# Altium footprint library Ultrascale_PcbLib.PcbLib: 126 footprints (part 8 of 8)
Each footprint in its own frame and in the unit in brackets; x right, y up, seen from the top. Pads: shape width x height; smd on the part's side, far side on the other; paste and mask are expansions set on the pad; w line width, h text height; cw(c..) or ccw(c..) is an arc to the next point about the centre after c.
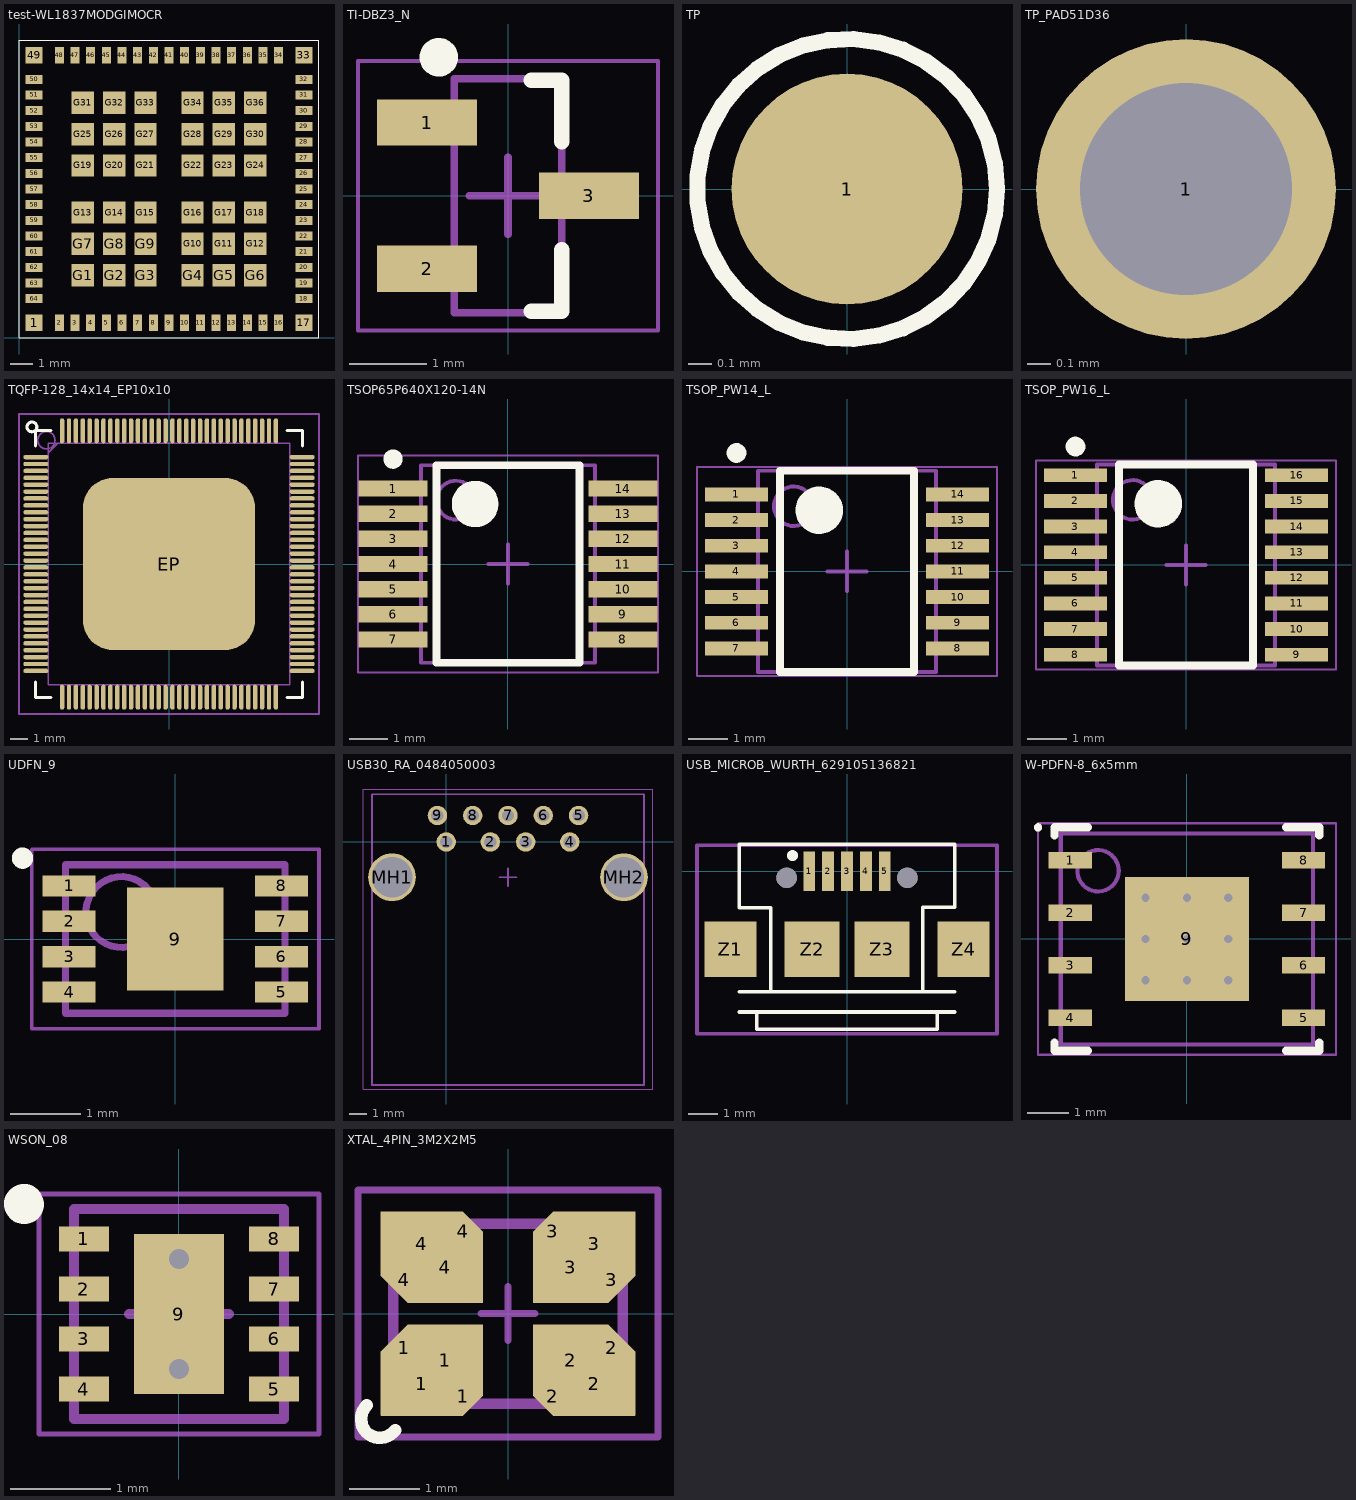
[diagram p7: the footprints below, top view; thin cyan lines are the x and y axes]

## test-WL1837MODGIMOCR [mm] "WL18x7MOD is a Wi-Fi,  dual-band, 2.4- and 5-GHz module solution"
pads (100):
  rect 0.75x0.75 smd mask+0.03: 1(0.675,0.675) 17(12.725,0.675) 33(12.725,12.625) 49(0.675,12.625)
  rect 0.4x0.75 smd mask+0.03: 2(1.8,0.675) 3(2.5,0.675) 4(3.2,0.675) 5(3.9,0.675) 6(4.6,0.675) 7(5.3,0.675) 8(6,0.675) 9(6.7,0.675) 10(7.4,0.675) 11(8.1,0.675) 12(8.8,0.675) 13(9.5,0.675) 14(10.2,0.675) 15(10.9,0.675) 16(11.6,0.675) 34(11.6,12.625) 35(10.9,12.625) 36(10.2,12.625) 37(9.5,12.625) 38(8.8,12.625) 39(8.1,12.625) 40(7.4,12.625) 41(6.7,12.625) 42(6,12.625) 43(5.3,12.625) 44(4.6,12.625) 45(3.9,12.625) 46(3.2,12.625) 47(2.5,12.625) 48(1.8,12.625)
  rect 0.75x0.4 smd mask+0.03: 18(12.725,1.75) 19(12.725,2.45) 20(12.725,3.15) 21(12.725,3.85) 22(12.725,4.55) 23(12.725,5.25) 24(12.725,5.95) 25(12.725,6.65) 26(12.725,7.35) 27(12.725,8.05) 28(12.725,8.75) 29(12.725,9.45) 30(12.725,10.15) 31(12.725,10.85) 32(12.725,11.55) 50(0.675,11.55) 51(0.675,10.85) 52(0.675,10.15) 53(0.675,9.45) 54(0.675,8.75) 55(0.675,8.05) 56(0.675,7.35) 57(0.675,6.65) 58(0.675,5.95) 59(0.675,5.25) 60(0.675,4.55) 61(0.675,3.85) 62(0.675,3.15) 63(0.675,2.45) 64(0.675,1.75)
  rect 1x1 smd mask+0.03: G1(2.85,2.8) G2(4.25,2.8) G3(5.65,2.8) G4(7.75,2.8) G5(9.15,2.8) G6(10.55,2.8) G7(2.85,4.2) G8(4.25,4.2) G9(5.65,4.2) G10(7.75,4.2) G11(9.15,4.2) G12(10.55,4.2) G13(2.85,5.6) G14(4.25,5.6) G15(5.65,5.6) G16(7.75,5.6) G17(9.15,5.6) G18(10.55,5.6) G19(2.85,7.7) G20(4.25,7.7) G21(5.65,7.7) G22(7.75,7.7) G23(9.15,7.7) G24(10.55,7.7) G25(2.85,9.1) G26(4.25,9.1) G27(5.65,9.1) G28(7.75,9.1) G29(9.15,9.1) G30(10.55,9.1) G31(2.85,10.5) G32(4.25,10.5) G33(5.65,10.5) G34(7.75,10.5) G35(9.15,10.5) G36(10.55,10.5)
Top Overlay:
  lines w0.05: 0,0 0,13.3 13.4,13.3 13.4,0 0,0

## TI-DBZ3_N [mm] "SOT23, 3-Leads, Body 2.92x1.3 mm, Pitch 0.95 mm, IPC Medium Density"
height 1.12
pads (3):
  rect 1.3x0.6 smd mask+0.05: 1(-1.05,0.95) 2(-1.05,-0.95) 3(1.05,0)
Top Overlay:
  circle w0.25: c-0.9,1.8 r0.125
  lines w0.2: 0.3,-1.5 0.7,-1.5 0.7,-0.7 ; 0.3,1.5 0.7,1.5 0.7,0.7
Mechanical 13:
  lines w0.1: -0.7,-1.52 0.7,-1.52 0.7,1.52 -0.7,1.52 -0.7,-1.52
Mechanical 15:
  lines w0.05: -1.95,-1.75 1.95,-1.75 1.95,1.75 -1.95,1.75 -1.95,-1.75
  lines w0.1: -0.5,0 0.5,0 ; 0,-0.5 0,0.5
3D body "DBZ0003A.stp": height 1, standoff 0, extent -1.27,-1.46 1.27,1.46

## TP [mm]
height 2.4
pads (1):
  round 1 smd: 1(0,0)
Top Overlay:
  circle w0.07: c0,0 r0.65

## TP_PAD51D36 [mil] "TEST POINT, PLATED THRU HOLE PAD51_DRILL36"
pads (1):
  round 51 hole 36: 1(0,0)

## TQFP-128_14x14_EP10x10 [mm] "TSQFP, 128-Leads, Body 14.00x14.00mm, Pitch 0.40mm, 10mm Epad, IPC Medium Density"
height 1.2
pads (129):
  oval 1.45x0.26 smd mask+0.102: 1(-7.725,6.2) 2(-7.725,5.8) 3(-7.725,5.4) 4(-7.725,5) 5(-7.725,4.6) 6(-7.725,4.2) 7(-7.725,3.8) 8(-7.725,3.4) 9(-7.725,3) 10(-7.725,2.6) 11(-7.725,2.2) 12(-7.725,1.8) 13(-7.725,1.4) 14(-7.725,1) 15(-7.725,0.6) 16(-7.725,0.2) 17(-7.725,-0.2) 18(-7.725,-0.6) 19(-7.725,-1) 20(-7.725,-1.4) 21(-7.725,-1.8) 22(-7.725,-2.2) 23(-7.725,-2.6) 24(-7.725,-3) 25(-7.725,-3.4) 26(-7.725,-3.8) 27(-7.725,-4.2) 28(-7.725,-4.6) 29(-7.725,-5) 30(-7.725,-5.4) 31(-7.725,-5.8) 32(-7.725,-6.2) 65(7.725,-6.2) 66(7.725,-5.8) 67(7.725,-5.4) 68(7.725,-5) 69(7.725,-4.6) 70(7.725,-4.2) 71(7.725,-3.8) 72(7.725,-3.4) 73(7.725,-3) 74(7.725,-2.6) 75(7.725,-2.2) 76(7.725,-1.8) 77(7.725,-1.4) 78(7.725,-1) 79(7.725,-0.6) 80(7.725,-0.2) 81(7.725,0.2) 82(7.725,0.6) 83(7.725,1) 84(7.725,1.4) 85(7.725,1.8) 86(7.725,2.2) 87(7.725,2.6) 88(7.725,3) 89(7.725,3.4) 90(7.725,3.8) 91(7.725,4.2) 92(7.725,4.6) 93(7.725,5) 94(7.725,5.4) 95(7.725,5.8) 96(7.725,6.2)
  oval 0.26x1.45 smd mask+0.102: 33(-6.2,-7.725) 34(-5.8,-7.725) 35(-5.4,-7.725) 36(-5,-7.725) 37(-4.6,-7.725) 38(-4.2,-7.725) 39(-3.8,-7.725) 40(-3.4,-7.725) 41(-3,-7.725) 42(-2.6,-7.725) 43(-2.2,-7.725) 44(-1.8,-7.725) 45(-1.4,-7.725) 46(-1,-7.725) 47(-0.6,-7.725) 48(-0.2,-7.725) 49(0.2,-7.725) 50(0.6,-7.725) 51(1,-7.725) 52(1.4,-7.725) 53(1.8,-7.725) 54(2.2,-7.725) 55(2.6,-7.725) 56(3,-7.725) 57(3.4,-7.725) 58(3.8,-7.725) 59(4.2,-7.725) 60(4.6,-7.725) 61(5,-7.725) 62(5.4,-7.725) 63(5.8,-7.725) 64(6.2,-7.725) 97(6.2,7.725) 98(5.8,7.725) 99(5.4,7.725) 100(5,7.725) 101(4.6,7.725) 102(4.2,7.725) 103(3.8,7.725) 104(3.4,7.725) 105(3,7.725) 106(2.6,7.725) 107(2.2,7.725) 108(1.8,7.725) 109(1.4,7.725) 110(1,7.725) 111(0.6,7.725) 112(0.2,7.725) 113(-0.2,7.725) 114(-0.6,7.725) 115(-1,7.725) 116(-1.4,7.725) 117(-1.8,7.725) 118(-2.2,7.725) 119(-2.6,7.725) 120(-3,7.725) 121(-3.4,7.725) 122(-3.8,7.725) 123(-4.2,7.725) 124(-4.6,7.725) 125(-5,7.725) 126(-5.4,7.725) 127(-5.8,7.725) 128(-6.2,7.725)
  rrect35% 10x10 smd paste-5: EP(0,0)
Top Overlay:
  circle w0.178: c-7.95,7.95 r0.284
  lines w0.178: -7.747,-6.858 -7.747,-7.747 -6.858,-7.747 ; -7.747,6.858 -7.747,7.747 -6.858,7.747 ; 6.858,-7.747 7.747,-7.747 7.747,-6.858 ; 6.858,7.747 7.747,7.747 7.747,6.858
Top Paste:
  rectangle: -1.25,-1.25 1.25,1.25
  rectangle: -4.25,-1.25 -1.75,1.25
  rectangle: 1.75,-1.25 4.25,1.25
  rectangle: 1.75,1.75 4.25,4.25
  rectangle: -1.25,1.75 1.25,4.25
  rectangle: -4.25,1.75 -1.75,4.25
  rectangle: -4.25,-4.25 -1.75,-1.75
  rectangle: -1.25,-4.25 1.25,-1.75
  rectangle: 1.75,-4.25 4.25,-1.75
Mechanical 11:
  circle w0.1: c-7.112,7.175 r0.5
  lines w0.1: -7,-7 7,-7 7,7 -6.462,7 -7,6.462 -7,-7
  text "1" at -6.35,4.572 h1.52
Mechanical 13:
  lines w0.1: -7,-7 -7,7 7,7 7,-7 -7,-7
Mechanical 15:
  lines w0.1: -0.5,0 0.5,0 ; 0,-0.5 0,0.5 ; -8.7,-8.7 -8.7,8.7 8.7,8.7 8.7,-8.7 -8.7,-8.7
3D body "TSQFP40P1600X1600X120-128N.step": height 1.2, standoff 0, extent -8,-8 8,8
3D body: height 0.05, standoff 0, extent -5,-5 5,5

## TSOP65P640X120-14N [mm] "TSOP, 14-Leads, Body 5.00x4.40mm, Pitch 0.65mm, IPC Medium Density"
height 1.2
pads (14):
  rect 1.78x0.42 smd: 1(-2.97,1.95) 2(-2.97,1.3) 3(-2.97,0.65) 4(-2.97,0) 5(-2.97,-0.65) 6(-2.97,-1.3) 7(-2.97,-1.95) 8(2.97,-1.95) 9(2.97,-1.3) 10(2.97,-0.65) 11(2.97,0) 12(2.97,0.65) 13(2.97,1.3) 14(2.97,1.95)
Top Overlay:
  circle w0.6: c-0.85,1.55 r0.3
  circle w0.25: c-2.97,2.71 r0.125
  lines w0.2: -1.85,-2.55 1.85,-2.55 1.85,2.55 -1.85,2.55 -1.85,-2.55
Mechanical 13:
  circle w0.1: c-1.35,1.65 r0.5
  lines w0.1: -2.25,-2.55 2.25,-2.55 2.25,2.55 -2.25,2.55 -2.25,-2.55
Mechanical 15:
  lines w0.05: -3.875,-2.8 3.875,-2.8 3.875,2.8 -3.875,2.8 -3.875,-2.8
  lines w0.1: -0.5,0 0.5,0 ; 0,-0.5 0,0.5
3D body: height 1.2, standoff 0.1, extent -2.25,-2.55 2.25,2.55

## TSOP_PW14_L [mm] "TSOP, 14-Leads, Body 5x4.4mm, Pitch 0.65mm, IPC High Density"
height 1.2
pads (14):
  rect 1.6x0.35 smd mask+0.05: 1(-2.8,1.95) 2(-2.8,1.3) 3(-2.8,0.65) 4(-2.8,0) 5(-2.8,-0.65) 6(-2.8,-1.3) 7(-2.8,-1.95) 8(2.8,-1.95) 9(2.8,-1.3) 10(2.8,-0.65) 11(2.8,0) 12(2.8,0.65) 13(2.8,1.3) 14(2.8,1.95)
Top Overlay:
  circle w0.25: c-2.8,3 r0.125
  circle w0.6: c-0.7,1.55 r0.3
  lines w0.2: -1.7,-2.55 -1.7,2.55 1.7,2.55 1.7,-2.55 -1.7,-2.55
Mechanical 13:
  circle w0.1: c-1.35,1.65 r0.5
  lines w0.1: -2.25,-2.55 -2.25,2.55 2.25,2.55 2.25,-2.55 -2.25,-2.55
Mechanical 15:
  lines w0.05: -3.8,-2.65 -3.8,2.65 3.8,2.65 3.8,-2.65 -3.8,-2.65
  lines w0.1: -0.5,0 0.5,0 ; 0,-0.5 0,0.5
3D body: height 1.2, standoff 0.05, extent -2.25,-2.55 2.25,2.55

## TSOP_PW16_L [mm] "TSOP, 16-Leads, Body 5x4.4mm, Pitch 0.65mm, IPC High Density"
height 1.2
pads (16):
  rect 1.6x0.35 smd mask+0.05: 1(-2.8,2.275) 2(-2.8,1.625) 3(-2.8,0.975) 4(-2.8,0.325) 5(-2.8,-0.325) 6(-2.8,-0.975) 7(-2.8,-1.625) 8(-2.8,-2.275) 9(2.8,-2.275) 10(2.8,-1.625) 11(2.8,-0.975) 12(2.8,-0.325) 13(2.8,0.325) 14(2.8,0.975) 15(2.8,1.625) 16(2.8,2.275)
Top Overlay:
  circle w0.6: c-0.7,1.55 r0.3
  circle w0.25: c-2.8,3 r0.125
  lines w0.2: -1.7,-2.55 1.7,-2.55 1.7,2.55 -1.7,2.55 -1.7,-2.55
Mechanical 13:
  circle w0.1: c-1.35,1.65 r0.5
  lines w0.1: -2.25,-2.55 2.25,-2.55 2.25,2.55 -2.25,2.55 -2.25,-2.55
Mechanical 15:
  lines w0.05: -3.8,-2.65 3.8,-2.65 3.8,2.65 -3.8,2.65 -3.8,-2.65
  lines w0.1: -0.5,0 0.5,0 ; 0,-0.5 0,0.5
3D body: height 1.2, standoff 0.05, extent -2.25,-2.55 2.25,2.55

## UDFN_9 [mm] "UDFN, 8-Leads, Body 3x2mm, Pitch 0.5mm"
height 0.6
pads (9):
  rect 0.75x0.3 smd mask+0.05: 1(-1.5,0.75) 2(-1.5,0.25) 3(-1.5,-0.25) 4(-1.5,-0.75) 5(1.5,-0.75) 6(1.5,-0.25) 7(1.5,0.25) 8(1.5,0.75)
  rect 1.36x1.46 smd mask+0.05: 9(0,0)
Top Overlay:
  circle w0.2: c-2.159,1.143 r0.05
Mechanical 13:
  circle w0.1: c-0.762,0.381 r0.5
  lines w0.1: -1.55,-1.05 -1.55,1.05 1.55,1.05 1.55,-1.05 -1.55,-1.05
Mechanical 15:
  lines w0.05: -2.032,-1.27 -2.032,1.27 2.032,1.27 2.032,-1.27 -2.032,-1.27
  lines w0.1: -0.5,0 0.5,0 ; 0,-0.5 0,0.5
3D body: height 0.6, standoff 0, extent -1.55,-1.024 1.55,1.024

## USB30_RA_0484050003 [mm] "USB 3.0 RA REC TH TYPE A"
height 8.5
pads (11):
  round 1.1 hole 0.7 mask+0.05: 1(0,0) 2(2.5,0) 3(4.5,0) 4(7,0) 5(7.5,1.5) 6(5.5,1.5) 7(3.5,1.5) 8(1.5,1.5) 9(-0.5,1.5)
  round 2.7 hole 2.3 mask+0.05: MH1(-3.07,-2) MH2(10.07,-2)
Mechanical 13:
  lines w0.1: -4.2,-13.78 -4.2,2.7 11.2,2.7 11.2,-13.78 -4.2,-13.78
Mechanical 15:
  lines w0.05: -4.7,-14 -4.7,3 11.7,3 11.7,-14 -4.7,-14
  lines w0.1: 3,-2 4,-2 ; 3.5,-2.5 3.5,-1.5
3D body "484050003.stp": height 7.56, standoff -4.04, extent -4.23,-13.78 11.23,2.72

## USB_MICROB_WURTH_629105136821 [mm] "5 pins"
height 3
pads (11):
  rect 0.4x1.35 smd mask+0.05: 1(-1.3,0) 2(-0.65,0) 3(0,0) 4(0.65,0) 5(1.3,0)
  rect 1.8x1.9 smd mask+0.05: Z1(-4,-2.675) Z4(4,-2.675)
  rect 1.9x1.9 smd mask+0.05: Z2(-1.2,-2.675) Z3(1.2,-2.675)
  round 0.7 hole 0.7 unplated mask+0.05: ""(-2.075,-0.225) ""(2.075,-0.225)
Top Overlay:
  circle w0.254: c-1.87,0.54 r0.06
  lines w0.12: -3.7,0.925 -3.7,-1.25 -2.625,-1.25 -2.625,-4.137 ; 2.6,-4.137 2.6,-1.225 3.7,-1.225 3.7,0.925
  lines w0.127: -3.7,-4.827 3.7,-4.827 ; -3.7,-4.137 3.7,-4.137 ; -3.7,0.925 3.7,0.925 ; -3.1,-4.827 -3.1,-5.425 3.1,-5.425 3.1,-4.827
Mechanical 15:
  lines w0.127: -5.15,-5.571 -5.15,0.9 5.15,0.9 5.15,-5.571 -5.15,-5.571
3D body "629105136821.stp": height 2.69, standoff -0.61, extent -4,-5.431 4,0.473

## W-PDFN-8_6x5mm [mm] "SON, 8-Leads, Body 5.00x6.00mm, Pitch 1.27mm, Thermal Pad 3.00x3.00mm, IPC Medium Density"
height 0.8
pads (9):
  rect 1.05x0.4 smd: 1(-2.82,1.905) 2(-2.82,0.635) 3(-2.82,-0.635) 4(-2.82,-1.905) 5(2.82,-1.905) 6(2.82,-0.635) 7(2.82,0.635) 8(2.82,1.905)
  rect 3x3 smd paste-1.5: 9(0,0)
via -1,1 diameter 0.5 hole 0.2
via 0,1 diameter 0.5 hole 0.2
via 1,1 diameter 0.5 hole 0.2
via -1,0 diameter 0.5 hole 0.2
via 0,0 diameter 0.5 hole 0.2
via 1,0 diameter 0.5 hole 0.2
via -1,-1 diameter 0.5 hole 0.2
via 0,-1 diameter 0.5 hole 0.2
via 1,-1 diameter 0.5 hole 0.2
Top Overlay:
  circle w0.1: c-3.6,2.7 r0.05
  lines w0.2: -3.2,-2.505 -3.2,-2.7 -2.395,-2.7 ; -3.2,2.505 -3.2,2.7 -2.395,2.7 ; 2.395,-2.7 3.2,-2.7 3.2,-2.505 ; 2.395,2.7 3.2,2.7 3.2,2.505
Top Paste:
  rectangle: -1.4,0.1 -0.1,1.4
  rectangle: -1.4,-1.4 -0.1,-0.1
  rectangle: 0.1,0.1 1.4,1.4
  rectangle: 0.1,-1.4 1.4,-0.1
Mechanical 13:
  circle w0.1: c-2.15,1.65 r0.5
  lines w0.1: -3.05,-2.55 -3.05,2.55 3.05,2.55 3.05,-2.55 -3.05,-2.55
Mechanical 15:
  lines w0.05: -3.605,-2.8 -3.605,2.8 3.605,2.8 3.605,-2.8 -3.605,-2.8
  lines w0.1: -0.5,0 0.5,0 ; 0,-0.5 0,0.5
3D body "SON127P600X80_HS-9N_2.step": height 0.8, standoff 0, extent -3.05,-2.55 3.05,2.55

## WSON_08 [mm] "TI WSON 0.8 Package  2mmx2mm"
height 0.8
pads (9):
  rect 0.5x0.25 smd paste+0 mask+0.05: 1(-0.95,0.75) 2(-0.95,0.25) 3(-0.95,-0.25) 4(-0.95,-0.75) 5(0.95,-0.75) 6(0.95,-0.25) 7(0.95,0.25) 8(0.95,0.75)
  rect 0.9x1.6 smd paste-5 mask+0.05: 9(0,0)
via 0,-0.55 diameter 0.5 hole 0.2
via 0,0.55 diameter 0.5 hole 0.2
Top Overlay:
  lines w0.3: -1.515,1.135 ccw(c-1.55,1.1) -1.5,1.1
Top Paste:
  rectangle: -0.45,0.1 0.45,0.8
  rectangle: -0.45,-0.8 0.45,-0.1
Mechanical 13:
  lines w0.1: -1.05,-1.05 1.05,-1.05 1.05,1.05 -1.05,1.05 -1.05,-1.05
Mechanical 15:
  lines w0.05: -1.4,-1.2 1.4,-1.2 1.4,1.2 -1.4,1.2 -1.4,-1.2
  lines w0.1: -0.5,0 0.5,0 ; 0,-0.5 0,0.5
3D body: height 0.81, standoff 0.8, extent -0.8,0.5 -0.5,0.8
3D body: height 0.8, standoff 0, extent -1.05,-1.05 1.05,1.05

## XTAL_4PIN_3M2X2M5 [mil] "Crystal 4 pin 3.2 x 2.5 mm"
height 39.37
pads (16):
  rrect1% 21.07x15.44 smd rot 45: 1(-58,-19) 3(58,19)
  rrect1% 46x36 smd: 1(-48,-39) 2(48,-39) 3(48,39) 4(-48,39)
  rrect1% 42x40 smd: 1(-35,-26) 2(35,-26) 3(35,26) 4(-35,26)
  rrect1% 15.44x15.44 smd rot 45: 1(-25,-46) 2(25,-46) 3(25,46) 4(-25,46)
  rrect1% 21.07x15.44 smd rot 135: 2(58,-19) 4(-58,19)
Top Overlay:
  lines w7: -78.74,-51.18 ccw(c-71.47,-58.76) -62.99,-64.96
Mechanical 11:
  lines w3.94: -64.96,-51.18 -64.96,51.18 64.96,51.18 64.96,-51.18 -64.96,-51.18
Mechanical 13:
  lines w3.94: -62.99,-49.21 -62.99,49.21 62.99,49.21 62.99,-49.21 -62.99,-49.21
Mechanical 15:
  lines w3.94: -15,0 15,0 ; 0,-15 0,15 ; -83.66,-68.9 83.66,-68.9 83.66,68.9 -83.66,68.9 -83.66,-68.9
3D body "XTAL-3_2x2_5.STEP": height 35.83, standoff -0.39, extent -62.99,-49.21 63,49.22